# Altium schematic symbol library jlcpcb_2025_04_inductors_extended_0603.schlib: 1269 symbols (part 3 of 7)
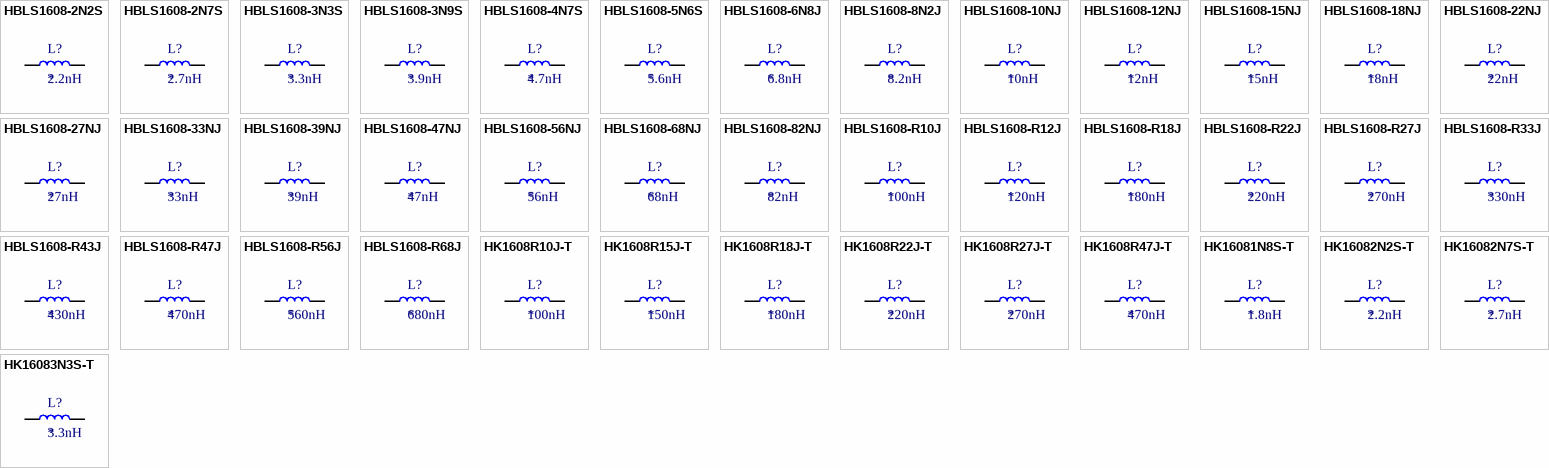
[diagram p33: symbols HBLS1608-2N2S to HK16083N3S-T]

## HBLS1608-82NJ
designator L?  Inductance: 82nH
Inductor, 82nH, ±5%, 1Ω, 300mA, SMD 0603; Manufacturer: HYHONGYEX; Manufacturer Part Number: HBLS1608-82NJ; Self-Resonant Frequency: 800MHz; Q Factor: 8@100MHz; Package Size: 0603; JLCPCB Basic Part: No; JLCPCB Part Number: C964039; Supplier 1: LCSC; Category: Inductors; Supplier Part Number 1: C964039; Tolerance: ±5%; Rated Current: 300mA; DC Resistance: 1Ω; RoHS: Yes; ComponentLink1Description: Datasheet; ComponentLink1URL: https://wmsc.lcsc.com/wmsc/upload/file/pdf/v2/lcsc/2012171939_HYHONGYEX-HBLS1608-82NJ_C964039.pdf; ComponentLink2Description: JLCPCB Part URL; ComponentLink2URL: https://jlcpcb.com/partdetail/C964039; ComponentLink3Description: LCSC Part URL; ComponentLink3URL: https://lcsc.com/product-detail/Inductors-SMD_HYHONGYEX-HYHONGYEX-HBLS1608-82NJ_C964039.html
footprint IND-0603 (0603 (1608M) Inductor)
pins: 1, 2

## HBLS1608-R10J
designator L?  Inductance: 100nH
Inductor, 100nH, ±5%, 1.2Ω, 300mA, SMD 0603; Manufacturer: HYHONGYEX; Manufacturer Part Number: HBLS1608-R10J; Self-Resonant Frequency: 700MHz; Q Factor: 8@100MHz; Package Size: 0603; JLCPCB Basic Part: No; JLCPCB Part Number: C964040; Supplier 1: LCSC; Category: Inductors; Supplier Part Number 1: C964040; Tolerance: ±5%; Rated Current: 300mA; DC Resistance: 1.2Ω; RoHS: Yes; ComponentLink1Description: Datasheet; ComponentLink1URL: https://wmsc.lcsc.com/wmsc/upload/file/pdf/v2/lcsc/2012171939_HYHONGYEX-HBLS1608-R10J_C964040.pdf; ComponentLink2Description: JLCPCB Part URL; ComponentLink2URL: https://jlcpcb.com/partdetail/C964040; ComponentLink3Description: LCSC Part URL; ComponentLink3URL: https://lcsc.com/product-detail/Inductors-SMD_HYHONGYEX-HYHONGYEX-HBLS1608-R10J_C964040.html
footprint IND-0603 (0603 (1608M) Inductor)
pins: 1, 2

## HBLS1608-R12J
designator L?  Inductance: 120nH
Inductor, 120nH, ±5%, 1.4Ω, 200mA, SMD 0603; Manufacturer: HYHONGYEX; Manufacturer Part Number: HBLS1608-R12J; Self-Resonant Frequency: 600MHz; Q Factor: 8@50MHz; Package Size: 0603; JLCPCB Basic Part: No; JLCPCB Part Number: C964041; Supplier 1: LCSC; Category: Inductors; Supplier Part Number 1: C964041; Tolerance: ±5%; Rated Current: 200mA; DC Resistance: 1.4Ω; RoHS: Yes; ComponentLink1Description: Datasheet; ComponentLink1URL: https://wmsc.lcsc.com/wmsc/upload/file/pdf/v2/lcsc/2012171939_HYHONGYEX-HBLS1608-R12J_C964041.pdf; ComponentLink2Description: JLCPCB Part URL; ComponentLink2URL: https://jlcpcb.com/partdetail/C964041; ComponentLink3Description: LCSC Part URL; ComponentLink3URL: https://lcsc.com/product-detail/Inductors-SMD_HYHONGYEX-HYHONGYEX-HBLS1608-R12J_C964041.html
footprint IND-0603 (0603 (1608M) Inductor)
pins: 1, 2

## HBLS1608-R18J
designator L?  Inductance: 180nH
Inductor, 180nH, ±5%, 1.9Ω, 200mA, SMD 0603; Manufacturer: HYHONGYEX; Manufacturer Part Number: HBLS1608-R18J; Self-Resonant Frequency: 400MHz; Q Factor: 8@50MHz; Package Size: 0603; JLCPCB Basic Part: No; JLCPCB Part Number: C964043; Supplier 1: LCSC; Category: Inductors; Supplier Part Number 1: C964043; Tolerance: ±5%; Rated Current: 200mA; DC Resistance: 1.9Ω; RoHS: Yes; ComponentLink1Description: Datasheet; ComponentLink1URL: https://wmsc.lcsc.com/wmsc/upload/file/pdf/v2/lcsc/2012171939_HYHONGYEX-HBLS1608-R18J_C964043.pdf; ComponentLink2Description: JLCPCB Part URL; ComponentLink2URL: https://jlcpcb.com/partdetail/C964043; ComponentLink3Description: LCSC Part URL; ComponentLink3URL: https://lcsc.com/product-detail/Inductors-SMD_HYHONGYEX-HYHONGYEX-HBLS1608-R18J_C964043.html
footprint IND-0603 (0603 (1608M) Inductor)
pins: 1, 2

## HBLS1608-R22J
designator L?  Inductance: 220nH
Inductor, 220nH, ±5%, 2.4Ω, 200mA, SMD 0603; Manufacturer: HYHONGYEX; Manufacturer Part Number: HBLS1608-R22J; Self-Resonant Frequency: 350MHz; Q Factor: 8@50MHz; Package Size: 0603; JLCPCB Basic Part: No; JLCPCB Part Number: C964044; Supplier 1: LCSC; Category: Inductors; Supplier Part Number 1: C964044; Tolerance: ±5%; Rated Current: 200mA; DC Resistance: 2.4Ω; RoHS: Yes; ComponentLink1Description: Datasheet; ComponentLink1URL: https://wmsc.lcsc.com/wmsc/upload/file/pdf/v2/lcsc/2012171939_HYHONGYEX-HBLS1608-R22J_C964044.pdf; ComponentLink2Description: JLCPCB Part URL; ComponentLink2URL: https://jlcpcb.com/partdetail/C964044; ComponentLink3Description: LCSC Part URL; ComponentLink3URL: https://lcsc.com/product-detail/Inductors-SMD_HYHONGYEX-HYHONGYEX-HBLS1608-R22J_C964044.html
footprint IND-0603 (0603 (1608M) Inductor)
pins: 1, 2

## HBLS1608-R27J
designator L?  Inductance: 270nH
Inductor, 270nH, ±2%, 2.6Ω, 150mA, SMD 0603; Manufacturer: HYHONGYEX; Manufacturer Part Number: HBLS1608-R27J; Self-Resonant Frequency: 350MHz; Q Factor: 8@50MHz; Package Size: 0603; JLCPCB Basic Part: No; JLCPCB Part Number: C964045; Supplier 1: LCSC; Category: Inductors; Supplier Part Number 1: C964045; Tolerance: ±2%; Rated Current: 150mA; DC Resistance: 2.6Ω; RoHS: Yes; ComponentLink1Description: Datasheet; ComponentLink1URL: https://wmsc.lcsc.com/wmsc/upload/file/pdf/v2/lcsc/2012171939_HYHONGYEX-HBLS1608-R27J_C964045.pdf; ComponentLink2Description: JLCPCB Part URL; ComponentLink2URL: https://jlcpcb.com/partdetail/C964045; ComponentLink3Description: LCSC Part URL; ComponentLink3URL: https://lcsc.com/product-detail/Inductors-SMD_HYHONGYEX-HYHONGYEX-HBLS1608-R27J_C964045.html
footprint IND-0603 (0603 (1608M) Inductor)
pins: 1, 2

## HBLS1608-R33J
designator L?  Inductance: 330nH
Inductor, 330nH, ±5%, 2.8Ω, 150mA, SMD 0603; Manufacturer: HYHONGYEX; Manufacturer Part Number: HBLS1608-R33J; Self-Resonant Frequency: 350MHz; Q Factor: 8@50MHz; Package Size: 0603; JLCPCB Basic Part: No; JLCPCB Part Number: C964046; Supplier 1: LCSC; Category: Inductors; Supplier Part Number 1: C964046; Tolerance: ±5%; Rated Current: 150mA; DC Resistance: 2.8Ω; RoHS: Yes; ComponentLink1Description: Datasheet; ComponentLink1URL: https://wmsc.lcsc.com/wmsc/upload/file/pdf/v2/lcsc/2012171939_HYHONGYEX-HBLS1608-R33J_C964046.pdf; ComponentLink2Description: JLCPCB Part URL; ComponentLink2URL: https://jlcpcb.com/partdetail/C964046; ComponentLink3Description: LCSC Part URL; ComponentLink3URL: https://lcsc.com/product-detail/Inductors-SMD_HYHONGYEX-HYHONGYEX-HBLS1608-R33J_C964046.html
footprint IND-0603 (0603 (1608M) Inductor)
pins: 1, 2

## HBLS1608-R43J
designator L?  Inductance: 430nH
Inductor, 430nH, ±5%, 3.4Ω, 150mA, SMD 0603; Manufacturer: HYHONGYEX; Manufacturer Part Number: HBLS1608-R43J; Self-Resonant Frequency: 280MHz; Q Factor: 8@50MHz; Package Size: 0603; JLCPCB Basic Part: No; JLCPCB Part Number: C964048; Supplier 1: LCSC; Category: Inductors; Supplier Part Number 1: C964048; Tolerance: ±5%; Rated Current: 150mA; DC Resistance: 3.4Ω; RoHS: Yes; ComponentLink1Description: Datasheet; ComponentLink1URL: https://wmsc.lcsc.com/wmsc/upload/file/pdf/v2/lcsc/2201131330_HYHONGYEX-HBLS1608-R43J_C964048.pdf; ComponentLink2Description: JLCPCB Part URL; ComponentLink2URL: https://jlcpcb.com/partdetail/C964048; ComponentLink3Description: LCSC Part URL; ComponentLink3URL: https://lcsc.com/product-detail/Inductors-SMD_HYHONGYEX-HYHONGYEX-HBLS1608-R43J_C964048.html
footprint IND-0603 (0603 (1608M) Inductor)
pins: 1, 2

## HBLS1608-R47J
designator L?  Inductance: 470nH
Inductor, 470nH, ±5%, 3.6Ω, 150mA, SMD 0603; Manufacturer: HYHONGYEX; Manufacturer Part Number: HBLS1608-R47J; Self-Resonant Frequency: 250MHz; Q Factor: 8@50MHz; Package Size: 0603; JLCPCB Basic Part: No; JLCPCB Part Number: C964049; Supplier 1: LCSC; Category: Inductors; Supplier Part Number 1: C964049; Tolerance: ±5%; Rated Current: 150mA; DC Resistance: 3.6Ω; RoHS: Yes; ComponentLink1Description: Datasheet; ComponentLink1URL: https://wmsc.lcsc.com/wmsc/upload/file/pdf/v2/lcsc/2012171939_HYHONGYEX-HBLS1608-R47J_C964049.pdf; ComponentLink2Description: JLCPCB Part URL; ComponentLink2URL: https://jlcpcb.com/partdetail/C964049; ComponentLink3Description: LCSC Part URL; ComponentLink3URL: https://lcsc.com/product-detail/Inductors-SMD_HYHONGYEX-HYHONGYEX-HBLS1608-R47J_C964049.html
footprint IND-0603 (0603 (1608M) Inductor)
pins: 1, 2

## HBLS1608-R56J
designator L?  Inductance: 560nH
Inductor, 560nH, ±5%, 4Ω, 100mA, SMD 0603; Manufacturer: HYHONGYEX; Manufacturer Part Number: HBLS1608-R56J; Self-Resonant Frequency: 250MHz; Q Factor: 8@50MHz; Package Size: 0603; JLCPCB Basic Part: No; JLCPCB Part Number: C964050; Supplier 1: LCSC; Category: Inductors; Supplier Part Number 1: C964050; Tolerance: ±5%; Rated Current: 100mA; DC Resistance: 4Ω; RoHS: Yes; ComponentLink1Description: Datasheet; ComponentLink1URL: https://wmsc.lcsc.com/wmsc/upload/file/pdf/v2/lcsc/2201131330_HYHONGYEX-HBLS1608-R56J_C964050.pdf; ComponentLink2Description: JLCPCB Part URL; ComponentLink2URL: https://jlcpcb.com/partdetail/C964050; ComponentLink3Description: LCSC Part URL; ComponentLink3URL: https://lcsc.com/product-detail/Inductors-SMD_HYHONGYEX-HYHONGYEX-HBLS1608-R56J_C964050.html
footprint IND-0603 (0603 (1608M) Inductor)
pins: 1, 2

## HBLS1608-R68J
designator L?  Inductance: 680nH
Inductor, 680nH, ±5%, 4.5Ω, 100mA, SMD 0603; Manufacturer: HYHONGYEX; Manufacturer Part Number: HBLS1608-R68J; Self-Resonant Frequency: 250MHz; Q Factor: 8@50MHz; Package Size: 0603; JLCPCB Basic Part: No; JLCPCB Part Number: C964051; Supplier 1: LCSC; Category: Inductors; Supplier Part Number 1: C964051; Tolerance: ±5%; Rated Current: 100mA; DC Resistance: 4.5Ω; RoHS: Yes; ComponentLink1Description: Datasheet; ComponentLink1URL: https://wmsc.lcsc.com/wmsc/upload/file/pdf/v2/lcsc/2201131330_HYHONGYEX-HBLS1608-R68J_C964051.pdf; ComponentLink2Description: JLCPCB Part URL; ComponentLink2URL: https://jlcpcb.com/partdetail/C964051; ComponentLink3Description: LCSC Part URL; ComponentLink3URL: https://lcsc.com/product-detail/Inductors-SMD_HYHONGYEX-HYHONGYEX-HBLS1608-R68J_C964051.html
footprint IND-0603 (0603 (1608M) Inductor)
pins: 1, 2

## HK1608R10J-T
designator L?  Inductance: 100nH
Inductor, 100nH, ±5%, 1Ω, 300mA, SMD 0603; Manufacturer: Taiyo Yuden; Manufacturer Part Number: HK1608R10J-T; Q Factor: 12@100MHz; Package Size: 0603; JLCPCB Basic Part: No; JLCPCB Part Number: C222678; Supplier 1: LCSC; Category: Inductors; Supplier Part Number 1: C222678; Tolerance: ±5%; Rated Current: 300mA; DC Resistance: 1Ω; RoHS: Yes; ComponentLink1Description: Datasheet; ComponentLink1URL: https://wmsc.lcsc.com/wmsc/upload/file/pdf/v2/lcsc/1810091458_Taiyo-Yuden-HK1608R10J-T_C222678.pdf; ComponentLink2Description: JLCPCB Part URL; ComponentLink2URL: https://jlcpcb.com/partdetail/C222678; ComponentLink3Description: LCSC Part URL; ComponentLink3URL: https://lcsc.com/product-detail/Inductors-SMD_Taiyo-Yuden-Taiyo-Yuden-HK1608R10J-T_C222678.html
footprint IND-0603 (0603 (1608M) Inductor)
pins: 1, 2

## HK1608R15J-T
designator L?  Inductance: 150nH
Inductor, 150nH, ±5%, 730mΩ, 300mA, SMD 0603; Manufacturer: Taiyo Yuden; Manufacturer Part Number: HK1608R15J-T; Self-Resonant Frequency: 500MHz; Q Factor: 8@100MHz; Package Size: 0603; JLCPCB Basic Part: No; JLCPCB Part Number: C222680; Supplier 1: LCSC; Category: Inductors; Supplier Part Number 1: C222680; Tolerance: ±5%; Rated Current: 300mA; DC Resistance: 730mΩ; RoHS: Yes; ComponentLink1Description: Datasheet; ComponentLink1URL: https://wmsc.lcsc.com/wmsc/upload/file/pdf/v2/lcsc/2304140030_Taiyo-Yuden-HK1608R15J-T_C222680.pdf; ComponentLink2Description: JLCPCB Part URL; ComponentLink2URL: https://jlcpcb.com/partdetail/C222680; ComponentLink3Description: LCSC Part URL; ComponentLink3URL: https://lcsc.com/product-detail/Inductors-SMD_Taiyo-Yuden-Taiyo-Yuden-HK1608R15J-T_C222680.html
footprint IND-0603 (0603 (1608M) Inductor)
pins: 1, 2

## HK1608R18J-T
designator L?  Inductance: 180nH
Inductor, 180nH, ±5%, 850mΩ, 300mA, SMD 0603; Manufacturer: Taiyo Yuden; Manufacturer Part Number: HK1608R18J-T; Self-Resonant Frequency: 400MHz; Q Factor: 8@100MHz; Package Size: 0603; JLCPCB Basic Part: No; JLCPCB Part Number: C222681; Supplier 1: LCSC; Category: Inductors; Supplier Part Number 1: C222681; Tolerance: ±5%; Rated Current: 300mA; DC Resistance: 850mΩ; RoHS: Yes; ComponentLink1Description: Datasheet; ComponentLink1URL: https://wmsc.lcsc.com/wmsc/upload/file/pdf/v2/lcsc/2304140030_Taiyo-Yuden-HK1608R18J-T_C222681.pdf; ComponentLink2Description: JLCPCB Part URL; ComponentLink2URL: https://jlcpcb.com/partdetail/C222681; ComponentLink3Description: LCSC Part URL; ComponentLink3URL: https://lcsc.com/product-detail/Inductors-SMD_Taiyo-Yuden-Taiyo-Yuden-HK1608R18J-T_C222681.html
footprint IND-0603 (0603 (1608M) Inductor)
pins: 1, 2

## HK1608R22J-T
designator L?  Inductance: 220nH
Inductor, 220nH, ±5%, 950mΩ, 300mA, SMD 0603; Manufacturer: Taiyo Yuden; Manufacturer Part Number: HK1608R22J-T; Q Factor: 8@100MHz; Package Size: 0603; JLCPCB Basic Part: No; JLCPCB Part Number: C222682; Supplier 1: LCSC; Category: Inductors; Supplier Part Number 1: C222682; Tolerance: ±5%; Rated Current: 300mA; DC Resistance: 950mΩ; RoHS: Yes; ComponentLink1Description: Datasheet; ComponentLink1URL: https://wmsc.lcsc.com/wmsc/upload/file/pdf/v2/lcsc/2304140030_Taiyo-Yuden-HK1608R22J-T_C222682.pdf; ComponentLink2Description: JLCPCB Part URL; ComponentLink2URL: https://jlcpcb.com/partdetail/C222682; ComponentLink3Description: LCSC Part URL; ComponentLink3URL: https://lcsc.com/product-detail/Inductors-SMD_Taiyo-Yuden-Taiyo-Yuden-HK1608R22J-T_C222682.html
footprint IND-0603 (0603 (1608M) Inductor)
pins: 1, 2

## HK1608R27J-T
designator L?  Inductance: 270nH
Inductor, 270nH, ±5%, 1.34Ω, 150mA, SMD 0603; Manufacturer: Taiyo Yuden; Manufacturer Part Number: HK1608R27J-T; Q Factor: 8@50MHz; Package Size: 0603; JLCPCB Basic Part: No; JLCPCB Part Number: C222683; Supplier 1: LCSC; Category: Inductors; Supplier Part Number 1: C222683; Tolerance: ±5%; Rated Current: 150mA; DC Resistance: 1.34Ω; RoHS: Yes; ComponentLink1Description: Datasheet; ComponentLink1URL: https://wmsc.lcsc.com/wmsc/upload/file/pdf/v2/lcsc/2304140030_Taiyo-Yuden-HK1608R27J-T_C222683.pdf; ComponentLink2Description: JLCPCB Part URL; ComponentLink2URL: https://jlcpcb.com/partdetail/C222683; ComponentLink3Description: LCSC Part URL; ComponentLink3URL: https://lcsc.com/product-detail/Inductors-SMD_Taiyo-Yuden-Taiyo-Yuden-HK1608R27J-T_C222683.html
footprint IND-0603 (0603 (1608M) Inductor)
pins: 1, 2

## HK1608R47J-T
designator L?  Inductance: 470nH
Inductor, 470nH, ±5%, 2.04Ω, 150mA, SMD 0603; Manufacturer: Taiyo Yuden; Manufacturer Part Number: HK1608R47J-T; Q Factor: 8@50MHz; Package Size: 0603; JLCPCB Basic Part: No; JLCPCB Part Number: C222686; Supplier 1: LCSC; Category: Inductors; Supplier Part Number 1: C222686; Tolerance: ±5%; Rated Current: 150mA; DC Resistance: 2.04Ω; RoHS: Yes; ComponentLink1Description: Datasheet; ComponentLink1URL: https://wmsc.lcsc.com/wmsc/upload/file/pdf/v2/lcsc/1912111437_Taiyo-Yuden-HK1608R47J-T_C222686.pdf; ComponentLink2Description: JLCPCB Part URL; ComponentLink2URL: https://jlcpcb.com/partdetail/C222686; ComponentLink3Description: LCSC Part URL; ComponentLink3URL: https://lcsc.com/product-detail/Inductors-SMD_Taiyo-Yuden-Taiyo-Yuden-HK1608R47J-T_C222686.html
footprint IND-0603 (0603 (1608M) Inductor)
pins: 1, 2

## HK16081N8S-T
designator L?  Inductance: 1.8nH
Inductor, 1.8nH, 60mΩ, 300mA, SMD 0603; Manufacturer: Taiyo Yuden; Manufacturer Part Number: HK16081N8S-T; Q Factor: 8@100MHz; Package Size: 0603; JLCPCB Basic Part: No; JLCPCB Part Number: C222661; Supplier 1: LCSC; Category: Inductors; Supplier Part Number 1: C222661; Rated Current: 300mA; DC Resistance: 60mΩ; RoHS: Yes; ComponentLink1Description: Datasheet; ComponentLink1URL: https://wmsc.lcsc.com/wmsc/upload/file/pdf/v2/lcsc/2304140030_Taiyo-Yuden-HK16081N8S-T_C222661.pdf; ComponentLink2Description: JLCPCB Part URL; ComponentLink2URL: https://jlcpcb.com/partdetail/C222661; ComponentLink3Description: LCSC Part URL; ComponentLink3URL: https://lcsc.com/product-detail/Inductors-SMD_Taiyo-Yuden-Taiyo-Yuden-HK16081N8S-T_C222661.html
footprint IND-0603 (0603 (1608M) Inductor)
pins: 1, 2

## HK16082N2S-T
designator L?  Inductance: 2.2nH
Inductor, 2.2nH, 60mΩ, 300mA, SMD 0603; Manufacturer: Taiyo Yuden; Manufacturer Part Number: HK16082N2S-T; Self-Resonant Frequency: 6GHz; Q Factor: 8@100MHz; Package Size: 0603; JLCPCB Basic Part: No; JLCPCB Part Number: C222662; Supplier 1: LCSC; Category: Inductors; Supplier Part Number 1: C222662; Rated Current: 300mA; DC Resistance: 60mΩ; RoHS: Yes; ComponentLink1Description: Datasheet; ComponentLink1URL: https://wmsc.lcsc.com/wmsc/upload/file/pdf/v2/lcsc/2304140030_Taiyo-Yuden-HK16082N2S-T_C222662.pdf; ComponentLink2Description: JLCPCB Part URL; ComponentLink2URL: https://jlcpcb.com/partdetail/C222662; ComponentLink3Description: LCSC Part URL; ComponentLink3URL: https://lcsc.com/product-detail/Inductors-SMD_Taiyo-Yuden-Taiyo-Yuden-HK16082N2S-T_C222662.html
footprint IND-0603 (0603 (1608M) Inductor)
pins: 1, 2

## HK16082N7S-T
designator L?  Inductance: 2.7nH
Inductor, 2.7nH, 60mΩ, 300mA, SMD 0603; Manufacturer: Taiyo Yuden; Manufacturer Part Number: HK16082N7S-T; Self-Resonant Frequency: 6GHz; Q Factor: 10@100MHz; Package Size: 0603; JLCPCB Basic Part: No; JLCPCB Part Number: C222663; Supplier 1: LCSC; Category: Inductors; Supplier Part Number 1: C222663; Rated Current: 300mA; DC Resistance: 60mΩ; RoHS: Yes; ComponentLink1Description: Datasheet; ComponentLink1URL: https://wmsc.lcsc.com/wmsc/upload/file/pdf/v2/lcsc/2304140030_Taiyo-Yuden-HK16082N7S-T_C222663.pdf; ComponentLink2Description: JLCPCB Part URL; ComponentLink2URL: https://jlcpcb.com/partdetail/C222663; ComponentLink3Description: LCSC Part URL; ComponentLink3URL: https://lcsc.com/product-detail/Inductors-SMD_Taiyo-Yuden-Taiyo-Yuden-HK16082N7S-T_C222663.html
footprint IND-0603 (0603 (1608M) Inductor)
pins: 1, 2

## HK16083N3S-T
designator L?  Inductance: 3.3nH
Inductor, 3.3nH, 120mΩ, 300mA, SMD 0603; Manufacturer: Taiyo Yuden; Manufacturer Part Number: HK16083N3S-T; Q Factor: 10@100MHz; Package Size: 0603; JLCPCB Basic Part: No; JLCPCB Part Number: C222664; Supplier 1: LCSC; Category: Inductors; Supplier Part Number 1: C222664; Rated Current: 300mA; DC Resistance: 120mΩ; RoHS: Yes; ComponentLink1Description: Datasheet; ComponentLink1URL: https://wmsc.lcsc.com/wmsc/upload/file/pdf/v2/lcsc/1810091458_Taiyo-Yuden-HK16083N3S-T_C222664.pdf; ComponentLink2Description: JLCPCB Part URL; ComponentLink2URL: https://jlcpcb.com/partdetail/C222664; ComponentLink3Description: LCSC Part URL; ComponentLink3URL: https://lcsc.com/product-detail/Inductors-SMD_Taiyo-Yuden-Taiyo-Yuden-HK16083N3S-T_C222664.html
footprint IND-0603 (0603 (1608M) Inductor)
pins: 1, 2

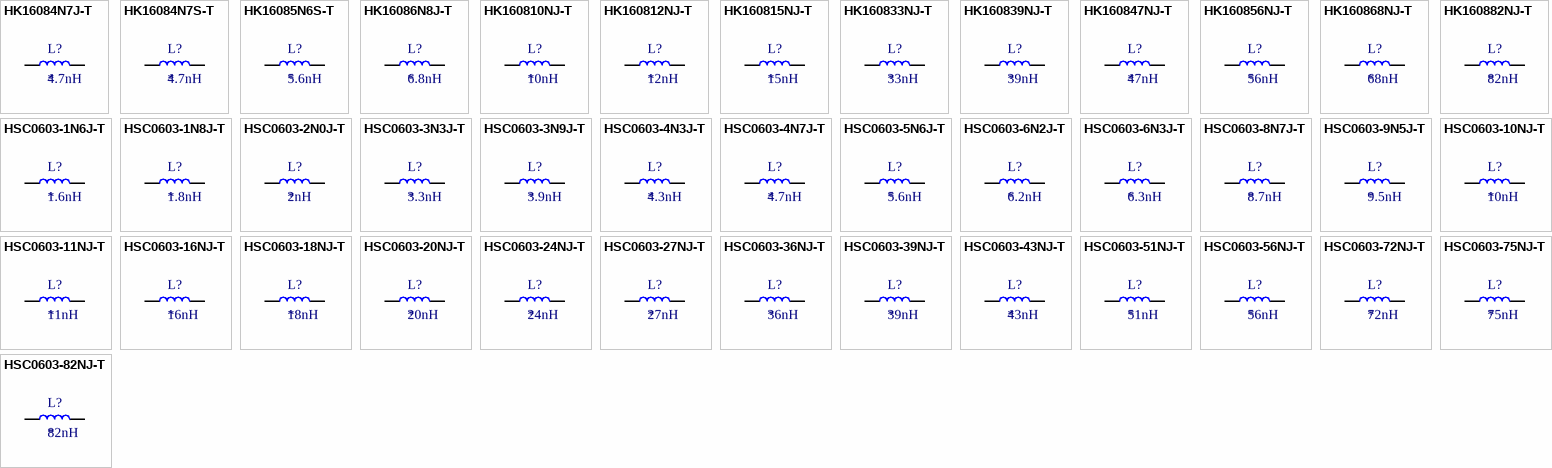
[diagram p10: symbols HK16084N7J-T to HSC0603-82NJ-T]

## HK16084N7J-T
designator L?  Inductance: 4.7nH
Inductor, 4.7nH, ±5%, 80mΩ, 300mA, SMD 0603; Manufacturer: Taiyo Yuden; Manufacturer Part Number: HK16084N7J-T; Package Size: 0603; JLCPCB Basic Part: No; JLCPCB Part Number: C267997; Supplier 1: LCSC; Category: Inductors; Supplier Part Number 1: C267997; Tolerance: ±5%; Rated Current: 300mA; DC Resistance: 80mΩ; RoHS: Yes; ComponentLink1Description: Datasheet; ComponentLink2Description: JLCPCB Part URL; ComponentLink2URL: https://jlcpcb.com/partdetail/C267997; ComponentLink3Description: LCSC Part URL; ComponentLink3URL: https://lcsc.com/product-detail/Inductors-SMD_Taiyo-Yuden-Taiyo-Yuden-HK16084N7J-T_C267997.html
footprint IND-0603 (0603 (1608M) Inductor)
pins: 1, 2

## HK16084N7S-T
designator L?  Inductance: 4.7nH
Inductor, 4.7nH, 80mΩ, 300mA, SMD 0603; Manufacturer: Taiyo Yuden; Manufacturer Part Number: HK16084N7S-T; Self-Resonant Frequency: 4GHz; Q Factor: 10@100MHz; Package Size: 0603; JLCPCB Basic Part: No; JLCPCB Part Number: C222665; Supplier 1: LCSC; Category: Inductors; Supplier Part Number 1: C222665; Rated Current: 300mA; DC Resistance: 80mΩ; RoHS: Yes; ComponentLink1Description: Datasheet; ComponentLink1URL: https://wmsc.lcsc.com/wmsc/upload/file/pdf/v2/lcsc/2304140030_Taiyo-Yuden-HK16084N7S-T_C222665.pdf; ComponentLink2Description: JLCPCB Part URL; ComponentLink2URL: https://jlcpcb.com/partdetail/C222665; ComponentLink3Description: LCSC Part URL; ComponentLink3URL: https://lcsc.com/product-detail/Inductors-SMD_Taiyo-Yuden-Taiyo-Yuden-HK16084N7S-T_C222665.html
footprint IND-0603 (0603 (1608M) Inductor)
pins: 1, 2

## HK16085N6S-T
designator L?  Inductance: 5.6nH
Inductor, 5.6nH, 180mΩ, 300mA, SMD 0603; Manufacturer: Taiyo Yuden; Manufacturer Part Number: HK16085N6S-T; Self-Resonant Frequency: 100MHz; Q Factor: 10@100MHz; Package Size: 0603; JLCPCB Basic Part: No; JLCPCB Part Number: C92901; Supplier 1: LCSC; Category: Inductors; Supplier Part Number 1: C92901; Rated Current: 300mA; DC Resistance: 180mΩ; RoHS: Yes; ComponentLink1Description: Datasheet; ComponentLink1URL: https://wmsc.lcsc.com/wmsc/upload/file/pdf/v2/lcsc/1810091433_Taiyo-Yuden-HK16085N6S-T_C92901.pdf; ComponentLink2Description: JLCPCB Part URL; ComponentLink2URL: https://jlcpcb.com/partdetail/C92901; ComponentLink3Description: LCSC Part URL; ComponentLink3URL: https://lcsc.com/product-detail/Inductors-SMD_Taiyo-Yuden-Taiyo-Yuden-HK16085N6S-T_C92901.html
footprint IND-0603 (0603 (1608M) Inductor)
pins: 1, 2

## HK16086N8J-T
designator L?  Inductance: 6.8nH
Inductor, 6.8nH, ±5%, 220mΩ, 300mA, SMD 0603; Manufacturer: Taiyo Yuden; Manufacturer Part Number: HK16086N8J-T; Self-Resonant Frequency: 100MHz; Q Factor: 10@100MHz; Package Size: 0603; JLCPCB Basic Part: No; JLCPCB Part Number: C92903; Supplier 1: LCSC; Category: Inductors; Supplier Part Number 1: C92903; Tolerance: ±5%; Rated Current: 300mA; DC Resistance: 220mΩ; RoHS: Yes; ComponentLink1Description: Datasheet; ComponentLink1URL: https://wmsc.lcsc.com/wmsc/upload/file/pdf/v2/lcsc/1810091422_Taiyo-Yuden-HK16086N8J-T_C92903.pdf; ComponentLink2Description: JLCPCB Part URL; ComponentLink2URL: https://jlcpcb.com/partdetail/C92903; ComponentLink3Description: LCSC Part URL; ComponentLink3URL: https://lcsc.com/product-detail/Inductors-SMD_Taiyo-Yuden-Taiyo-Yuden-HK16086N8J-T_C92903.html
footprint IND-0603 (0603 (1608M) Inductor)
pins: 1, 2

## HK160810NJ-T
designator L?  Inductance: 10nH
Inductor, 10nH, ±5%, 260mΩ, 300mA, SMD 0603; Manufacturer: Taiyo Yuden; Manufacturer Part Number: HK160810NJ-T; Q Factor: 12@100MHz; Package Size: 0603; JLCPCB Basic Part: No; JLCPCB Part Number: C222667; Supplier 1: LCSC; Category: Inductors; Supplier Part Number 1: C222667; Tolerance: ±5%; Rated Current: 300mA; DC Resistance: 260mΩ; RoHS: Yes; ComponentLink1Description: Datasheet; ComponentLink1URL: https://wmsc.lcsc.com/wmsc/upload/file/pdf/v2/lcsc/1810091458_Taiyo-Yuden-HK160810NJ-T_C222667.pdf; ComponentLink2Description: JLCPCB Part URL; ComponentLink2URL: https://jlcpcb.com/partdetail/C222667; ComponentLink3Description: LCSC Part URL; ComponentLink3URL: https://lcsc.com/product-detail/Inductors-SMD_Taiyo-Yuden-Taiyo-Yuden-HK160810NJ-T_C222667.html
footprint IND-0603 (0603 (1608M) Inductor)
pins: 1, 2

## HK160812NJ-T
designator L?  Inductance: 12nH
Inductor, 12nH, ±5%, 170mΩ, 300mA, SMD 0603; Manufacturer: Taiyo Yuden; Manufacturer Part Number: HK160812NJ-T; Q Factor: 12@100MHz; Package Size: 0603; JLCPCB Basic Part: No; JLCPCB Part Number: C222668; Supplier 1: LCSC; Category: Inductors; Supplier Part Number 1: C222668; Tolerance: ±5%; Rated Current: 300mA; DC Resistance: 170mΩ; RoHS: Yes; ComponentLink1Description: Datasheet; ComponentLink1URL: https://wmsc.lcsc.com/wmsc/upload/file/pdf/v2/lcsc/2304140030_Taiyo-Yuden-HK160812NJ-T_C222668.pdf; ComponentLink2Description: JLCPCB Part URL; ComponentLink2URL: https://jlcpcb.com/partdetail/C222668; ComponentLink3Description: LCSC Part URL; ComponentLink3URL: https://lcsc.com/product-detail/Inductors-SMD_Taiyo-Yuden-Taiyo-Yuden-HK160812NJ-T_C222668.html
footprint IND-0603 (0603 (1608M) Inductor)
pins: 1, 2

## HK160815NJ-T
designator L?  Inductance: 15nH
Inductor, 15nH, ±5%, 320mΩ, 300mA, SMD 0603; Manufacturer: Taiyo Yuden; Manufacturer Part Number: HK160815NJ-T; Q Factor: 12@100MHz; Package Size: 0603; JLCPCB Basic Part: No; JLCPCB Part Number: C222669; Supplier 1: LCSC; Category: Inductors; Supplier Part Number 1: C222669; Tolerance: ±5%; Rated Current: 300mA; DC Resistance: 320mΩ; RoHS: Yes; ComponentLink1Description: Datasheet; ComponentLink1URL: https://wmsc.lcsc.com/wmsc/upload/file/pdf/v2/lcsc/1810091458_Taiyo-Yuden-HK160815NJ-T_C222669.pdf; ComponentLink2Description: JLCPCB Part URL; ComponentLink2URL: https://jlcpcb.com/partdetail/C222669; ComponentLink3Description: LCSC Part URL; ComponentLink3URL: https://lcsc.com/product-detail/Inductors-SMD_Taiyo-Yuden-Taiyo-Yuden-HK160815NJ-T_C222669.html
footprint IND-0603 (0603 (1608M) Inductor)
pins: 1, 2

## HK160833NJ-T
designator L?  Inductance: 33nH
Inductor, 33nH, ±5%, 550mΩ, 300mA, SMD 0603; Manufacturer: Taiyo Yuden; Manufacturer Part Number: HK160833NJ-T; Self-Resonant Frequency: 100MHz; Q Factor: 12@100MHz; Package Size: 0603; JLCPCB Basic Part: No; JLCPCB Part Number: C222673; Supplier 1: LCSC; Category: Inductors; Supplier Part Number 1: C222673; Tolerance: ±5%; Rated Current: 300mA; DC Resistance: 550mΩ; RoHS: Yes; ComponentLink1Description: Datasheet; ComponentLink1URL: https://wmsc.lcsc.com/wmsc/upload/file/pdf/v2/lcsc/1810091458_Taiyo-Yuden-HK160833NJ-T_C222673.pdf; ComponentLink2Description: JLCPCB Part URL; ComponentLink2URL: https://jlcpcb.com/partdetail/C222673; ComponentLink3Description: LCSC Part URL; ComponentLink3URL: https://lcsc.com/product-detail/Inductors-SMD_Taiyo-Yuden-Taiyo-Yuden-HK160833NJ-T_C222673.html
footprint IND-0603 (0603 (1608M) Inductor)
pins: 1, 2

## HK160839NJ-T
designator L?  Inductance: 39nH
Inductor, 39nH, ±5%, 600mΩ, 300mA, SMD 0603; Manufacturer: Taiyo Yuden; Manufacturer Part Number: HK160839NJ-T; Q Factor: 12@100MHz; Package Size: 0603; JLCPCB Basic Part: No; JLCPCB Part Number: C222674; Supplier 1: LCSC; Category: Inductors; Supplier Part Number 1: C222674; Tolerance: ±5%; Rated Current: 300mA; DC Resistance: 600mΩ; RoHS: Yes; ComponentLink1Description: Datasheet; ComponentLink1URL: https://wmsc.lcsc.com/wmsc/upload/file/pdf/v2/lcsc/1810091458_Taiyo-Yuden-HK160839NJ-T_C222674.pdf; ComponentLink2Description: JLCPCB Part URL; ComponentLink2URL: https://jlcpcb.com/partdetail/C222674; ComponentLink3Description: LCSC Part URL; ComponentLink3URL: https://lcsc.com/product-detail/Inductors-SMD_Taiyo-Yuden-Taiyo-Yuden-HK160839NJ-T_C222674.html
footprint IND-0603 (0603 (1608M) Inductor)
pins: 1, 2

## HK160847NJ-T
designator L?  Inductance: 47nH
Inductor, 47nH, ±5%, 450mΩ, 300mA, SMD 0603; Manufacturer: Taiyo Yuden; Manufacturer Part Number: HK160847NJ-T; Self-Resonant Frequency: 900MHz; Q Factor: 12@100MHz; Package Size: 0603; JLCPCB Basic Part: No; JLCPCB Part Number: C222675; Supplier 1: LCSC; Category: Inductors; Supplier Part Number 1: C222675; Tolerance: ±5%; Rated Current: 300mA; DC Resistance: 450mΩ; RoHS: Yes; ComponentLink1Description: Datasheet; ComponentLink1URL: https://wmsc.lcsc.com/wmsc/upload/file/pdf/v2/lcsc/2304140030_Taiyo-Yuden-HK160847NJ-T_C222675.pdf; ComponentLink2Description: JLCPCB Part URL; ComponentLink2URL: https://jlcpcb.com/partdetail/C222675; ComponentLink3Description: LCSC Part URL; ComponentLink3URL: https://lcsc.com/product-detail/Inductors-SMD_Taiyo-Yuden-Taiyo-Yuden-HK160847NJ-T_C222675.html
footprint IND-0603 (0603 (1608M) Inductor)
pins: 1, 2

## HK160856NJ-T
designator L?  Inductance: 56nH
Inductor, 56nH, ±5%, 500mΩ, 300mA, SMD 0603; Manufacturer: Taiyo Yuden; Manufacturer Part Number: HK160856NJ-T; Q Factor: 12@100MHz; Package Size: 0603; JLCPCB Basic Part: No; JLCPCB Part Number: C222676; Supplier 1: LCSC; Category: Inductors; Supplier Part Number 1: C222676; Tolerance: ±5%; Rated Current: 300mA; DC Resistance: 500mΩ; RoHS: Yes; ComponentLink1Description: Datasheet; ComponentLink1URL: https://wmsc.lcsc.com/wmsc/upload/file/pdf/v2/lcsc/2304140030_Taiyo-Yuden-HK160856NJ-T_C222676.pdf; ComponentLink2Description: JLCPCB Part URL; ComponentLink2URL: https://jlcpcb.com/partdetail/C222676; ComponentLink3Description: LCSC Part URL; ComponentLink3URL: https://lcsc.com/product-detail/Inductors-SMD_Taiyo-Yuden-Taiyo-Yuden-HK160856NJ-T_C222676.html
footprint IND-0603 (0603 (1608M) Inductor)
pins: 1, 2

## HK160868NJ-T
designator L?  Inductance: 68nH
Inductor, 68nH, ±5%, 850mΩ, 300mA, SMD 0603; Manufacturer: Taiyo Yuden; Manufacturer Part Number: HK160868NJ-T; Q Factor: 12@100MHz; Package Size: 0603; JLCPCB Basic Part: No; JLCPCB Part Number: C92902; Supplier 1: LCSC; Category: Inductors; Supplier Part Number 1: C92902; Tolerance: ±5%; Rated Current: 300mA; DC Resistance: 850mΩ; RoHS: Yes; ComponentLink1Description: Datasheet; ComponentLink1URL: https://wmsc.lcsc.com/wmsc/upload/file/pdf/v2/lcsc/1810091410_Taiyo-Yuden-HK160868NJ-T_C92902.pdf; ComponentLink2Description: JLCPCB Part URL; ComponentLink2URL: https://jlcpcb.com/partdetail/C92902; ComponentLink3Description: LCSC Part URL; ComponentLink3URL: https://lcsc.com/product-detail/Inductors-SMD_Taiyo-Yuden-Taiyo-Yuden-HK160868NJ-T_C92902.html
footprint IND-0603 (0603 (1608M) Inductor)
pins: 1, 2

## HK160882NJ-T
designator L?  Inductance: 82nH
Inductor, 82nH, ±5%, 600mΩ, 300mA, SMD 0603; Manufacturer: Taiyo Yuden; Manufacturer Part Number: HK160882NJ-T; Q Factor: 12@100MHz; Package Size: 0603; JLCPCB Basic Part: No; JLCPCB Part Number: C222677; Supplier 1: LCSC; Category: Inductors; Supplier Part Number 1: C222677; Tolerance: ±5%; Rated Current: 300mA; DC Resistance: 600mΩ; RoHS: Yes; ComponentLink1Description: Datasheet; ComponentLink1URL: https://wmsc.lcsc.com/wmsc/upload/file/pdf/v2/lcsc/2304140030_Taiyo-Yuden-HK160882NJ-T_C222677.pdf; ComponentLink2Description: JLCPCB Part URL; ComponentLink2URL: https://jlcpcb.com/partdetail/C222677; ComponentLink3Description: LCSC Part URL; ComponentLink3URL: https://lcsc.com/product-detail/Inductors-SMD_Taiyo-Yuden-Taiyo-Yuden-HK160882NJ-T_C222677.html
footprint IND-0603 (0603 (1608M) Inductor)
pins: 1, 2

## HSC0603-1N6J-T
designator L?  Inductance: 1.6nH
Inductor, 1.6nH, ±5%, 30mΩ, 700mA, SMD 0603; Manufacturer: EMTEK; Manufacturer Part Number: HSC0603-1N6J-T; Self-Resonant Frequency: 12.5GHz; Q Factor: 24@250MHz; Package Size: 0603; JLCPCB Basic Part: No; JLCPCB Part Number: C251771; Supplier 1: LCSC; Category: Inductors; Supplier Part Number 1: C251771; Tolerance: ±5%; Rated Current: 700mA; DC Resistance: 30mΩ; RoHS: Yes; ComponentLink1Description: Datasheet; ComponentLink1URL: https://wmsc.lcsc.com/wmsc/upload/file/pdf/v2/lcsc/2304140030_EMTEK-HSC0603-1N6J-T_C251771.pdf; ComponentLink2Description: JLCPCB Part URL; ComponentLink2URL: https://jlcpcb.com/partdetail/C251771; ComponentLink3Description: LCSC Part URL; ComponentLink3URL: https://lcsc.com/product-detail/Inductors-SMD_EMTEK-EMTEK-HSC0603-1N6J-T_C251771.html
footprint IND-0603 (0603 (1608M) Inductor)
pins: 1, 2

## HSC0603-1N8J-T
designator L?  Inductance: 1.8nH
Inductor, 1.8nH, ±5%, 45mΩ, 700mA, SMD 0603; Manufacturer: EMTEK; Manufacturer Part Number: HSC0603-1N8J-T; Self-Resonant Frequency: 12.5GHz; Q Factor: 16@250MHz; Package Size: 0603; JLCPCB Basic Part: No; JLCPCB Part Number: C251772; Supplier 1: LCSC; Category: Inductors; Supplier Part Number 1: C251772; Tolerance: ±5%; Rated Current: 700mA; DC Resistance: 45mΩ; RoHS: Yes; ComponentLink1Description: Datasheet; ComponentLink1URL: https://wmsc.lcsc.com/wmsc/upload/file/pdf/v2/lcsc/2304140030_EMTEK-HSC0603-1N8J-T_C251772.pdf; ComponentLink2Description: JLCPCB Part URL; ComponentLink2URL: https://jlcpcb.com/partdetail/C251772; ComponentLink3Description: LCSC Part URL; ComponentLink3URL: https://lcsc.com/product-detail/Inductors-SMD_EMTEK-EMTEK-HSC0603-1N8J-T_C251772.html
footprint IND-0603 (0603 (1608M) Inductor)
pins: 1, 2

## HSC0603-2N0J-T
designator L?  Inductance: 2nH
Inductor, 2nH, ±5%, 700mA, SMD 0603; Manufacturer: EMTEK; Manufacturer Part Number: HSC0603-2N0J-T; Package Size: 0603; JLCPCB Basic Part: No; JLCPCB Part Number: C251777; Supplier 1: LCSC; Category: Inductors; Supplier Part Number 1: C251777; Tolerance: ±5%; Rated Current: 700mA; RoHS: Yes; ComponentLink1Description: Datasheet; ComponentLink1URL: https://wmsc.lcsc.com/wmsc/upload/file/pdf/v2/lcsc/2304140030_EMTEK-HSC0603-2N0J-T_C251777.pdf; ComponentLink2Description: JLCPCB Part URL; ComponentLink2URL: https://jlcpcb.com/partdetail/C251777; ComponentLink3Description: LCSC Part URL; ComponentLink3URL: https://lcsc.com/product-detail/Inductors-SMD_EMTEK-EMTEK-HSC0603-2N0J-T_C251777.html
footprint IND-0603 (0603 (1608M) Inductor)
pins: 1, 2

## HSC0603-3N3J-T
designator L?  Inductance: 3.3nH
Inductor, 3.3nH, ±5%, 45mΩ, 700mA, SMD 0603; Manufacturer: EMTEK; Manufacturer Part Number: HSC0603-3N3J-T; Self-Resonant Frequency: 5.9GHz; Q Factor: 30@250MHz; Package Size: 0603; JLCPCB Basic Part: No; JLCPCB Part Number: C251782; Supplier 1: LCSC; Category: Inductors; Supplier Part Number 1: C251782; Tolerance: ±5%; Rated Current: 700mA; DC Resistance: 45mΩ; RoHS: Yes; ComponentLink1Description: Datasheet; ComponentLink1URL: https://wmsc.lcsc.com/wmsc/upload/file/pdf/v2/lcsc/2304140030_EMTEK-HSC0603-3N3J-T_C251782.pdf; ComponentLink2Description: JLCPCB Part URL; ComponentLink2URL: https://jlcpcb.com/partdetail/C251782; ComponentLink3Description: LCSC Part URL; ComponentLink3URL: https://lcsc.com/product-detail/Inductors-SMD_EMTEK-EMTEK-HSC0603-3N3J-T_C251782.html
footprint IND-0603 (0603 (1608M) Inductor)
pins: 1, 2

## HSC0603-3N9J-T
designator L?  Inductance: 3.9nH
Inductor, 3.9nH, ±5%, 80mΩ, 700mA, SMD 0603; Manufacturer: EMTEK; Manufacturer Part Number: HSC0603-3N9J-T; Self-Resonant Frequency: 6.9GHz; Q Factor: 22@250MHz; Package Size: 0603; JLCPCB Basic Part: No; JLCPCB Part Number: C251784; Supplier 1: LCSC; Category: Inductors; Supplier Part Number 1: C251784; Tolerance: ±5%; Rated Current: 700mA; DC Resistance: 80mΩ; RoHS: Yes; ComponentLink1Description: Datasheet; ComponentLink1URL: https://wmsc.lcsc.com/wmsc/upload/file/pdf/v2/lcsc/2304140030_EMTEK-HSC0603-3N9J-T_C251784.pdf; ComponentLink2Description: JLCPCB Part URL; ComponentLink2URL: https://jlcpcb.com/partdetail/C251784; ComponentLink3Description: LCSC Part URL; ComponentLink3URL: https://lcsc.com/product-detail/Inductors-SMD_EMTEK-EMTEK-HSC0603-3N9J-T_C251784.html
footprint IND-0603 (0603 (1608M) Inductor)
pins: 1, 2

## HSC0603-4N3J-T
designator L?  Inductance: 4.3nH
Inductor, 4.3nH, ±5%, 63mΩ, 700mA, SMD 0603; Manufacturer: EMTEK; Manufacturer Part Number: HSC0603-4N3J-T; Self-Resonant Frequency: 5.9GHz; Q Factor: 22@250MHz; Package Size: 0603; JLCPCB Basic Part: No; JLCPCB Part Number: C251787; Supplier 1: LCSC; Category: Inductors; Supplier Part Number 1: C251787; Tolerance: ±5%; Rated Current: 700mA; DC Resistance: 63mΩ; RoHS: Yes; ComponentLink1Description: Datasheet; ComponentLink1URL: https://wmsc.lcsc.com/wmsc/upload/file/pdf/v2/lcsc/2304140030_EMTEK-HSC0603-4N3J-T_C251787.pdf; ComponentLink2Description: JLCPCB Part URL; ComponentLink2URL: https://jlcpcb.com/partdetail/C251787; ComponentLink3Description: LCSC Part URL; ComponentLink3URL: https://lcsc.com/product-detail/Inductors-SMD_EMTEK-EMTEK-HSC0603-4N3J-T_C251787.html
footprint IND-0603 (0603 (1608M) Inductor)
pins: 1, 2

## HSC0603-4N7J-T
designator L?  Inductance: 4.7nH
Inductor, 4.7nH, ±5%, 85mΩ, 700mA, SMD 0603; Manufacturer: EMTEK; Manufacturer Part Number: HSC0603-4N7J-T; Self-Resonant Frequency: 5.8GHz; Q Factor: 20@250MHz; Package Size: 0603; JLCPCB Basic Part: No; JLCPCB Part Number: C251788; Supplier 1: LCSC; Category: Inductors; Supplier Part Number 1: C251788; Tolerance: ±5%; Rated Current: 700mA; DC Resistance: 85mΩ; RoHS: Yes; ComponentLink1Description: Datasheet; ComponentLink1URL: https://wmsc.lcsc.com/wmsc/upload/file/pdf/v2/lcsc/2304140030_EMTEK-HSC0603-4N7J-T_C251788.pdf; ComponentLink2Description: JLCPCB Part URL; ComponentLink2URL: https://jlcpcb.com/partdetail/C251788; ComponentLink3Description: LCSC Part URL; ComponentLink3URL: https://lcsc.com/product-detail/Inductors-SMD_EMTEK-EMTEK-HSC0603-4N7J-T_C251788.html
footprint IND-0603 (0603 (1608M) Inductor)
pins: 1, 2

## HSC0603-5N6J-T
designator L?  Inductance: 5.6nH
Inductor, 5.6nH, ±5%, 160mΩ, 700mA, SMD 0603; Manufacturer: EMTEK; Manufacturer Part Number: HSC0603-5N6J-T; Self-Resonant Frequency: 5.8GHz; Q Factor: 20@250MHz; Package Size: 0603; JLCPCB Basic Part: No; JLCPCB Part Number: C251791; Supplier 1: LCSC; Category: Inductors; Supplier Part Number 1: C251791; Tolerance: ±5%; Rated Current: 700mA; DC Resistance: 160mΩ; RoHS: Yes; ComponentLink1Description: Datasheet; ComponentLink1URL: https://wmsc.lcsc.com/wmsc/upload/file/pdf/v2/lcsc/2304140030_EMTEK-HSC0603-5N6J-T_C251791.pdf; ComponentLink2Description: JLCPCB Part URL; ComponentLink2URL: https://jlcpcb.com/partdetail/C251791; ComponentLink3Description: LCSC Part URL; ComponentLink3URL: https://lcsc.com/product-detail/Inductors-SMD_EMTEK-EMTEK-HSC0603-5N6J-T_C251791.html
footprint IND-0603 (0603 (1608M) Inductor)
pins: 1, 2

## HSC0603-6N2J-T
designator L?  Inductance: 6.2nH
Inductor, 6.2nH, ±5%, 700mA, SMD 0603; Manufacturer: EMTEK; Manufacturer Part Number: HSC0603-6N2J-T; Package Size: 0603; JLCPCB Basic Part: No; JLCPCB Part Number: C251794; Supplier 1: LCSC; Category: Inductors; Supplier Part Number 1: C251794; Tolerance: ±5%; Rated Current: 700mA; RoHS: Yes; ComponentLink1Description: Datasheet; ComponentLink1URL: https://wmsc.lcsc.com/wmsc/upload/file/pdf/v2/lcsc/2304140030_EMTEK-HSC0603-6N2J-T_C251794.pdf; ComponentLink2Description: JLCPCB Part URL; ComponentLink2URL: https://jlcpcb.com/partdetail/C251794; ComponentLink3Description: LCSC Part URL; ComponentLink3URL: https://lcsc.com/product-detail/Inductors-SMD_EMTEK-EMTEK-HSC0603-6N2J-T_C251794.html
footprint IND-0603 (0603 (1608M) Inductor)
pins: 1, 2

## HSC0603-6N3J-T
designator L?  Inductance: 6.3nH
Inductor, 6.3nH, ±5%, 115mΩ, 700mA, SMD 0603; Manufacturer: EMTEK; Manufacturer Part Number: HSC0603-6N3J-T; Self-Resonant Frequency: 5.7GHz; Q Factor: 26@250MHz; Package Size: 0603; JLCPCB Basic Part: No; JLCPCB Part Number: C251795; Supplier 1: LCSC; Category: Inductors; Supplier Part Number 1: C251795; Tolerance: ±5%; Rated Current: 700mA; DC Resistance: 115mΩ; RoHS: Yes; ComponentLink1Description: Datasheet; ComponentLink1URL: https://wmsc.lcsc.com/wmsc/upload/file/pdf/v2/lcsc/2304140030_EMTEK-HSC0603-6N3J-T_C251795.pdf; ComponentLink2Description: JLCPCB Part URL; ComponentLink2URL: https://jlcpcb.com/partdetail/C251795; ComponentLink3Description: LCSC Part URL; ComponentLink3URL: https://lcsc.com/product-detail/Inductors-SMD_EMTEK-EMTEK-HSC0603-6N3J-T_C251795.html
footprint IND-0603 (0603 (1608M) Inductor)
pins: 1, 2

## HSC0603-8N7J-T
designator L?  Inductance: 8.7nH
Inductor, 8.7nH, ±5%, 109mΩ, 700mA, SMD 0603; Manufacturer: EMTEK; Manufacturer Part Number: HSC0603-8N7J-T; Self-Resonant Frequency: 4.6GHz; Q Factor: 28@250MHz; Package Size: 0603; JLCPCB Basic Part: No; JLCPCB Part Number: C251801; Supplier 1: LCSC; Category: Inductors; Supplier Part Number 1: C251801; Tolerance: ±5%; Rated Current: 700mA; DC Resistance: 109mΩ; RoHS: Yes; ComponentLink1Description: Datasheet; ComponentLink1URL: https://wmsc.lcsc.com/wmsc/upload/file/pdf/v2/lcsc/2304140030_EMTEK-HSC0603-8N7J-T_C251801.pdf; ComponentLink2Description: JLCPCB Part URL; ComponentLink2URL: https://jlcpcb.com/partdetail/C251801; ComponentLink3Description: LCSC Part URL; ComponentLink3URL: https://lcsc.com/product-detail/Inductors-SMD_EMTEK-EMTEK-HSC0603-8N7J-T_C251801.html
footprint IND-0603 (0603 (1608M) Inductor)
pins: 1, 2

## HSC0603-9N5J-T
designator L?  Inductance: 9.5nH
Inductor, 9.5nH, ±5%, 145mΩ, 700mA, SMD 0603; Manufacturer: EMTEK; Manufacturer Part Number: HSC0603-9N5J-T; Self-Resonant Frequency: 5.4GHz; Q Factor: 28@250MHz; Package Size: 0603; JLCPCB Basic Part: No; JLCPCB Part Number: C251804; Supplier 1: LCSC; Category: Inductors; Supplier Part Number 1: C251804; Tolerance: ±5%; Rated Current: 700mA; DC Resistance: 145mΩ; RoHS: Yes; ComponentLink1Description: Datasheet; ComponentLink1URL: https://wmsc.lcsc.com/wmsc/upload/file/pdf/v2/lcsc/2304140030_EMTEK-HSC0603-9N5J-T_C251804.pdf; ComponentLink2Description: JLCPCB Part URL; ComponentLink2URL: https://jlcpcb.com/partdetail/C251804; ComponentLink3Description: LCSC Part URL; ComponentLink3URL: https://lcsc.com/product-detail/Inductors-SMD_EMTEK-EMTEK-HSC0603-9N5J-T_C251804.html
footprint IND-0603 (0603 (1608M) Inductor)
pins: 1, 2

## HSC0603-10NJ-T
designator L?  Inductance: 10nH
Inductor, 10nH, ±5%, 145mΩ, 700mA, SMD 0603; Manufacturer: EMTEK; Manufacturer Part Number: HSC0603-10NJ-T; Self-Resonant Frequency: 4.8GHz; Q Factor: 31@250MHz; Package Size: 0603; JLCPCB Basic Part: No; JLCPCB Part Number: C251764; Supplier 1: LCSC; Category: Inductors; Supplier Part Number 1: C251764; Tolerance: ±5%; Rated Current: 700mA; DC Resistance: 145mΩ; RoHS: Yes; ComponentLink1Description: Datasheet; ComponentLink1URL: https://wmsc.lcsc.com/wmsc/upload/file/pdf/v2/lcsc/2304140030_EMTEK-HSC0603-10NJ-T_C251764.pdf; ComponentLink2Description: JLCPCB Part URL; ComponentLink2URL: https://jlcpcb.com/partdetail/C251764; ComponentLink3Description: LCSC Part URL; ComponentLink3URL: https://lcsc.com/product-detail/Inductors-SMD_EMTEK-EMTEK-HSC0603-10NJ-T_C251764.html
footprint IND-0603 (0603 (1608M) Inductor)
pins: 1, 2
